# Altium footprint library module-footprint.PcbLib: 27 footprints (part 2 of 2)
Each footprint in its own frame and in the unit in brackets; x right, y up, seen from the top. Pads: shape width x height; smd on the part's side, far side on the other; paste and mask are expansions set on the pad; w line width, h text height; cw(c..) or ccw(c..) is an arc to the next point about the centre after c.
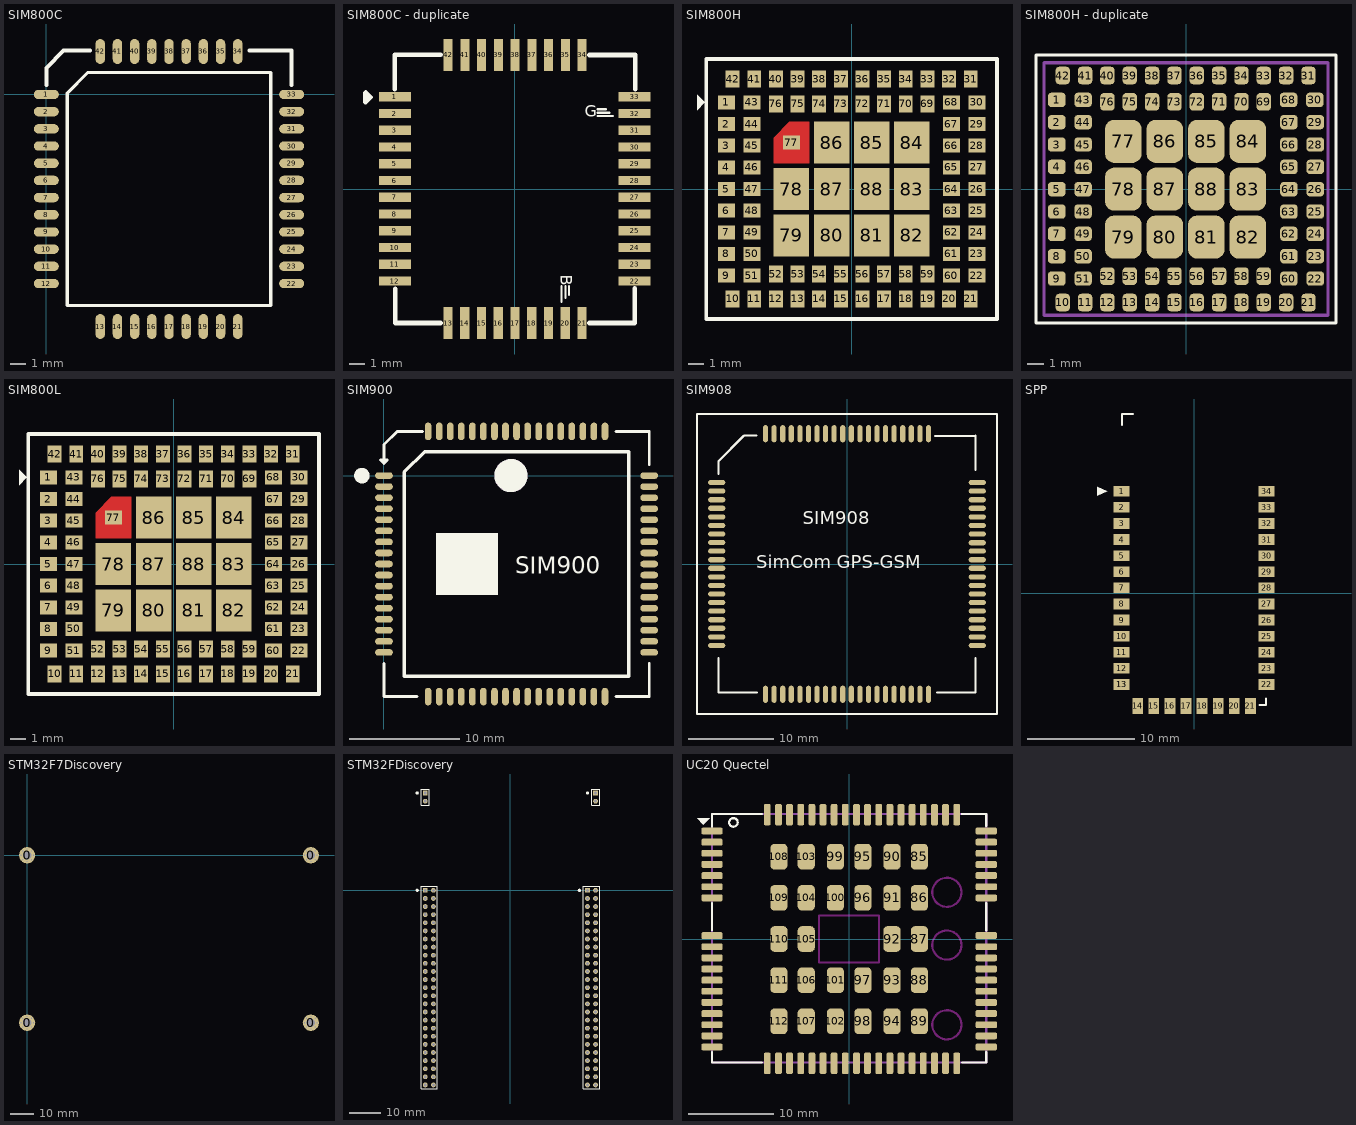
[diagram p1: the footprints below, top view; thin cyan lines are the x and y axes]

## SIM800C [mm]
pads (42):
  oval 1.6x0.6 smd: 1(0,0) 2(0,-1.1) 3(0,-2.2) 4(0,-3.3) 5(0,-4.4) 6(0,-5.5) 7(0,-6.6) 8(0,-7.7) 9(0,-8.8) 10(0,-9.9) 11(0,-11) 12(0,-12.1) 22(15.7,-12.1) 23(15.7,-11) 24(15.7,-9.9) 25(15.7,-8.8) 26(15.7,-7.7) 27(15.7,-6.6) 28(15.7,-5.5) 29(15.7,-4.4) 30(15.7,-3.3) 31(15.7,-2.2) 32(15.7,-1.1) 33(15.7,0)
  oval 0.6x1.6 smd: 13(3.45,-14.85) 14(4.55,-14.85) 15(5.65,-14.85) 16(6.75,-14.85) 17(7.85,-14.85) 18(8.95,-14.85) 19(10.05,-14.85) 20(11.15,-14.85) 21(12.25,-14.85) 34(12.25,2.75) 35(11.15,2.75) 36(10.05,2.75) 37(8.95,2.75) 38(7.85,2.75) 39(6.75,2.75) 40(5.65,2.75) 41(4.55,2.75) 42(3.45,2.75)
Top Overlay:
  lines w0.2: 1.335,-13.515 1.335,0.08 2.67,1.415 14.365,1.415 14.365,-13.515 1.335,-13.515
  lines w0.254: 0,0.6 0,1.7 1.1,2.8 2.8,2.8 ; 13,2.8 15.7,2.8 15.7,0.6
3D body "User Library-SIM800C-1.STEP": height 2.37, standoff 0.03, extent -0.01,-14.85 15.69,2.75

## SIM800C - duplicate [mm]
pads (42):
  rect 2.1x0.6 smd: 1(-7.87,6.058) 2(-7.87,4.958) 3(-7.87,3.858) 4(-7.87,2.758) 5(-7.87,1.658) 6(-7.87,0.558) 7(-7.87,-0.542) 8(-7.87,-1.642) 9(-7.87,-2.742) 10(-7.87,-3.842) 11(-7.87,-4.942) 12(-7.87,-6.042) 22(7.87,-6.042) 23(7.87,-4.942) 24(7.87,-3.842) 25(7.87,-2.742) 26(7.87,-1.642) 27(7.87,-0.542) 28(7.87,0.558) 29(7.87,1.658) 30(7.87,2.758) 31(7.87,3.858) 32(7.87,4.958) 33(7.87,6.058)
  rect 0.6x2.1 smd: 13(-4.378,-8.801) 14(-3.278,-8.801) 15(-2.178,-8.801) 16(-1.078,-8.801) 17(0.022,-8.801) 18(1.122,-8.801) 19(2.222,-8.801) 20(3.322,-8.801) 21(4.422,-8.801) 34(4.43,8.801) 35(3.33,8.801) 36(2.23,8.801) 37(1.13,8.801) 38(0.03,8.801) 39(-1.07,8.801) 40(-2.17,8.801) 41(-3.27,8.801) 42(-4.37,8.801)
Top Overlay:
  lines w0.15: 3.078,-7.404 3.078,-6.388 ; 3.332,-7.15 3.332,-6.388 ; 3.56,-6.947 3.56,-6.388 ; 5.44,4.788 6.456,4.788 ; 5.44,5.016 6.202,5.016 ; 5.44,5.245 5.999,5.245
  lines w0.3: -9.8,6.312 -9.8,5.702 -9.495,6.007 ; -9.775,6.337 -9.47,6.032 ; -7.87,6.54 -7.87,8.808 -5.22,8.808 -4.856,8.808 ; -7.858,-6.54 -7.858,-8.801 -4.853,-8.801 ; 4.904,-8.801 7.87,-8.801 7.87,-7.861 7.87,-6.515 ; 4.906,8.801 5.248,8.801 7.898,8.801 ; 7.915,6.54 7.915,8.808
  text "G" at 4.602,4.737 h0.76
  text "B" at 3.027,-5.626 h0.76
3D body "User Library-SIM800C-1.STEP": height 2.47, standoff 0.13, extent -7.8,-8.8 7.9,8.8

## SIM800H [mm]
pads (88):
  rect 1.1x0.9 smd: 1(-8.1,5.6) 2(-8.1,4.2) 3(-8.1,2.8) 4(-8.1,1.4) 5(-8.1,0) 6(-8.1,-1.4) 7(-8.1,-2.8) 8(-8.1,-4.2) 9(-8.1,-5.6) 22(8.1,-5.6) 23(8.1,-4.2) 24(8.1,-2.8) 25(8.1,-1.4) 26(8.1,0) 27(8.1,1.4) 28(8.1,2.8) 29(8.1,4.2) 30(8.1,5.6) 43(-6.45,5.6) 44(-6.45,4.2) 45(-6.45,2.8) 46(-6.45,1.4) 47(-6.45,0) 48(-6.45,-1.4) 49(-6.45,-2.8) 50(-6.45,-4.2) 51(-6.45,-5.6) 60(6.45,-5.6) 61(6.45,-4.2) 62(6.45,-2.8) 63(6.45,-1.4) 64(6.45,0) 65(6.45,1.4) 66(6.45,2.8) 67(6.45,4.2) 68(6.45,5.6) 77(-3.9,3)
  rect 0.9x1.1 smd: 10(-7.7,-7.1) 11(-6.3,-7.1) 12(-4.9,-7.1) 13(-3.5,-7.1) 14(-2.1,-7.1) 15(-0.7,-7.1) 16(0.7,-7.1) 17(2.1,-7.1) 18(3.5,-7.1) 19(4.9,-7.1) 20(6.3,-7.1) 21(7.7,-7.1) 31(7.7,7.1) 32(6.3,7.1) 33(4.9,7.1) 34(3.5,7.1) 35(2.1,7.1) 36(0.7,7.1) 37(-0.7,7.1) 38(-2.1,7.1) 39(-3.5,7.1) 40(-4.9,7.1) 41(-6.3,7.1) 42(-7.7,7.1) 52(-4.9,-5.5) 53(-3.5,-5.5) 54(-2.1,-5.5) 55(-0.7,-5.5) 56(0.7,-5.5) 57(2.1,-5.5) 58(3.5,-5.5) 59(4.9,-5.5) 69(4.9,5.5) 70(3.5,5.5) 71(2.1,5.5) 72(0.7,5.5) 73(-0.7,5.5) 74(-2.1,5.5) 75(-3.5,5.5) 76(-4.9,5.5)
  rect 2.3x2.7 smd: 78(-3.9,0) 79(-3.9,-3) 80(-1.3,-3) 81(1.3,-3) 82(3.9,-3) 83(3.9,0) 84(3.9,3) 85(1.3,3) 86(-1.3,3) 87(-1.3,0) 88(1.3,0)
Top Layer:
  region: -5.05,1.65 -2.75,1.65 -2.75,4.35 -4.02,4.35 -5.05,3.32
Top Overlay:
  region: -9.5,5.6 -10,6.1 -10,5.1
  lines w0.254: -9.4,-8.4 -9.4,8.4 9.4,8.4 9.4,-8.4 -9.4,-8.4
3D body "User Library-SIM800H.step": height 2.42, standoff 0, extent -8.9,-7.9 8.9,7.9

## SIM800H - duplicate [mm]
pads (88):
  rrect50% 1.1x0.9 smd: 1(-8.1,5.587) 2(-8.1,4.187) 3(-8.1,2.787) 4(-8.1,1.387) 5(-8.1,-0.013) 6(-8.1,-1.413) 7(-8.1,-2.813) 8(-8.1,-4.213) 9(-8.1,-5.613) 22(8.1,-5.613) 23(8.1,-4.212) 24(8.1,-2.812) 25(8.1,-1.412) 26(8.1,-0.012) 27(8.1,1.388) 28(8.1,2.788) 29(8.1,4.188) 30(8.075,5.587) 43(-6.45,5.587) 44(-6.45,4.187) 45(-6.45,2.787) 46(-6.45,1.387) 47(-6.45,-0.013) 48(-6.45,-1.413) 49(-6.45,-2.813) 50(-6.45,-4.213) 51(-6.45,-5.613) 60(6.45,-5.613) 61(6.45,-4.213) 62(6.45,-2.813) 63(6.45,-1.413) 64(6.45,-0.013) 65(6.45,1.387) 66(6.45,2.787) 67(6.45,4.187) 68(6.425,5.587)
  rrect50% 0.9x1.1 smd: 10(-7.725,-7.113) 11(-6.325,-7.113) 12(-4.925,-7.113) 13(-3.525,-7.113) 14(-2.125,-7.113) 15(-0.725,-7.113) 16(0.675,-7.113) 17(2.075,-7.113) 18(3.475,-7.113) 19(4.875,-7.113) 20(6.275,-7.113) 21(7.675,-7.113) 31(7.675,7.113) 32(6.275,7.113) 33(4.875,7.113) 34(3.475,7.113) 35(2.075,7.113) 36(0.675,7.113) 37(-0.725,7.113) 38(-2.125,7.113) 39(-3.525,7.113) 40(-4.925,7.113) 41(-6.325,7.113) 42(-7.725,7.113) 52(-4.925,-5.463) 53(-3.525,-5.463) 54(-2.125,-5.463) 55(-0.725,-5.463) 56(0.675,-5.463) 57(2.075,-5.463) 58(3.475,-5.463) 59(4.875,-5.463) 69(4.875,5.463) 70(3.475,5.463) 71(2.075,5.463) 72(0.675,5.463) 73(-0.725,5.463) 74(-2.125,5.463) 75(-3.525,5.463) 76(-4.925,5.463)
  rrect50% 2.3x2.7 smd: 77(-3.925,2.987) 78(-3.925,-0.013) 79(-3.925,-3.013) 80(-1.325,-3.013) 81(1.275,-3.013) 82(3.875,-3.013) 83(3.875,-0.013) 84(3.875,2.987) 85(1.275,2.987) 86(-1.325,2.987) 87(-1.325,-0.013) 88(1.275,-0.013)
Top Overlay:
  lines w0.2: -9.4,-8.4 -9.4,8.4 9.4,8.4 9.4,-8.4 -9.4,-8.4
Mechanical 1:
  lines w0.2: -8.9,-7.912 8.9,-7.912 8.9,7.913 -8.9,7.913 -8.9,-7.912
3D body "User Library-SIM800H.STEP": height 2.42, standoff 0, extent -8.9,-7.9 8.9,7.9

## SIM800L [mm]
pads (88):
  rect 1.1x0.9 smd: 1(-8.1,5.6) 2(-8.1,4.2) 3(-8.1,2.8) 4(-8.1,1.4) 5(-8.1,0) 6(-8.1,-1.4) 7(-8.1,-2.8) 8(-8.1,-4.2) 9(-8.1,-5.6) 22(8.1,-5.6) 23(8.1,-4.2) 24(8.1,-2.8) 25(8.1,-1.4) 26(8.1,0) 27(8.1,1.4) 28(8.1,2.8) 29(8.1,4.2) 30(8.1,5.6) 43(-6.45,5.6) 44(-6.45,4.2) 45(-6.45,2.8) 46(-6.45,1.4) 47(-6.45,0) 48(-6.45,-1.4) 49(-6.45,-2.8) 50(-6.45,-4.2) 51(-6.45,-5.6) 60(6.45,-5.6) 61(6.45,-4.2) 62(6.45,-2.8) 63(6.45,-1.4) 64(6.45,0) 65(6.45,1.4) 66(6.45,2.8) 67(6.45,4.2) 68(6.45,5.6) 77(-3.9,3)
  rect 0.9x1.1 smd: 10(-7.7,-7.1) 11(-6.3,-7.1) 12(-4.9,-7.1) 13(-3.5,-7.1) 14(-2.1,-7.1) 15(-0.7,-7.1) 16(0.7,-7.1) 17(2.1,-7.1) 18(3.5,-7.1) 19(4.9,-7.1) 20(6.3,-7.1) 21(7.7,-7.1) 31(7.7,7.1) 32(6.3,7.1) 33(4.9,7.1) 34(3.5,7.1) 35(2.1,7.1) 36(0.7,7.1) 37(-0.7,7.1) 38(-2.1,7.1) 39(-3.5,7.1) 40(-4.9,7.1) 41(-6.3,7.1) 42(-7.7,7.1) 52(-4.9,-5.5) 53(-3.5,-5.5) 54(-2.1,-5.5) 55(-0.7,-5.5) 56(0.7,-5.5) 57(2.1,-5.5) 58(3.5,-5.5) 59(4.9,-5.5) 69(4.9,5.5) 70(3.5,5.5) 71(2.1,5.5) 72(0.7,5.5) 73(-0.7,5.5) 74(-2.1,5.5) 75(-3.5,5.5) 76(-4.9,5.5)
  rect 2.3x2.7 smd: 78(-3.9,0) 79(-3.9,-3) 80(-1.3,-3) 81(1.3,-3) 82(3.9,-3) 83(3.9,0) 84(3.9,3) 85(1.3,3) 86(-1.3,3) 87(-1.3,0) 88(1.3,0)
Top Layer:
  region: -5.05,1.65 -2.75,1.65 -2.75,4.35 -4.02,4.35 -5.05,3.32
Top Overlay:
  region: -9.5,5.6 -10,6.1 -10,5.1
  lines w0.254: -9.4,-8.4 -9.4,8.4 9.4,8.4 9.4,-8.4 -9.4,-8.4
3D body "User Library-SIM800L-1.step": height 2.5, standoff 0, extent -8.925,-7.9 8.925,7.9

## SIM900 [mm]
pads (68):
  oval 1.6x0.6 smd: 1(0,0) 2(0,-1) 3(0,-2) 4(0,-3) 5(0,-4) 6(0,-5) 7(0,-6) 8(0,-7) 9(0,-8) 10(0,-9) 11(0,-10) 12(0,-11) 13(0,-12) 14(0,-13) 15(0,-14) 16(0,-15) 17(0,-16) 35(24,-16) 36(24,-15) 37(24,-14) 38(24,-13) 39(24,-12) 40(24,-11) 41(24,-10) 42(24,-9) 43(24,-8) 44(24,-7) 45(24,-6) 46(24,-5) 47(24,-4) 48(24,-3) 49(24,-2) 50(24,-1) 51(24,0)
  oval 0.6x1.6 smd: 18(4,-20) 19(5,-20) 20(6,-20) 21(7,-20) 22(8,-20) 23(9,-20) 24(10,-20) 25(11,-20) 26(12,-20) 27(13,-20) 28(14,-20) 29(15,-20) 30(16,-20) 31(17,-20) 32(18,-20) 33(19,-20) 34(20,-20) 52(20,4) 53(19,4) 54(18,4) 55(17,4) 56(16,4) 57(15,4) 58(14,4) 59(13,4) 60(12,4) 61(11,4) 62(10,4) 63(9,4) 64(8,4) 65(7,4) 66(6,4) 67(5,4) 68(4,4)
Top Overlay:
  circle w1.5: c11.5,0 r0.75
  circle w0.7: c-2,0 r0.35
  rectangle: 4.7,-10.8 10.3,-5.2
  lines w0.254: 0,-17 0,-20 3,-20 ; 0,1.4 0,2.8 1.2,4 3.5,4 ; 21,-20 24,-20 24,-17 ; 21,4 24,4 24,1 ; 0,1.1 0,1.1 ; 0,1.1 -0.3,1.4 0.3,1.4 0,1.1
  lines w0.3: 1.835,-18.165 22.165,-18.165 22.165,2.165 3.67,2.165 1.835,0.33 1.835,-18.165
  text "SIM900" at 11.9,-8.9 h1.52
Keep-Out Layer:
  circle w1.5: c11.5,0 r0.75
  rectangle: 4.7,-10.8 10.3,-5.2
3D body "User Library-SIM900.step": height 3.12, standoff 0.1, extent 0,-20 24,4

## SIM908 [mm]
pads (80):
  oval 2x0.6 smd: 1(-15.2,9.5) 2(-15.2,8.5) 3(-15.2,7.5) 4(-15.2,6.5) 5(-15.2,5.5) 6(-15.2,4.5) 7(-15.2,3.5) 8(-15.2,2.5) 9(-15.2,1.5) 10(-15.2,0.5) 11(-15.2,-0.5) 12(-15.2,-1.5) 13(-15.2,-2.5) 14(-15.2,-3.5) 15(-15.2,-4.5) 16(-15.2,-5.5) 17(-15.2,-6.5) 18(-15.2,-7.5) 19(-15.2,-8.5) 20(-15.2,-9.5) 41(15.2,-9.5) 42(15.2,-8.5) 43(15.2,-7.5) 44(15.2,-6.5) 45(15.2,-5.5) 46(15.2,-4.5) 47(15.2,-3.5) 48(15.2,-2.5) 49(15.2,-1.5) 50(15.2,-0.5) 51(15.2,0.5) 52(15.2,1.5) 53(15.2,2.475) 54(15.2,3.5) 55(15.2,4.5) 56(15.2,5.5) 57(15.2,6.5) 58(15.2,7.5) 59(15.2,8.5) 60(15.2,9.5)
  oval 0.6x2 smd: 21(-9.5,-15.2) 22(-8.5,-15.2) 23(-7.5,-15.2) 24(-6.5,-15.2) 25(-5.5,-15.2) 26(-4.5,-15.2) 27(-3.5,-15.2) 28(-2.5,-15.2) 29(-1.5,-15.2) 30(-0.5,-15.2) 31(0.5,-15.2) 32(1.5,-15.2) 33(2.5,-15.2) 34(3.5,-15.2) 35(4.5,-15.2) 36(5.5,-15.2) 37(6.5,-15.2) 38(7.5,-15.2) 39(8.5,-15.2) 40(9.5,-15.2) 61(9.5,15.2) 62(8.5,15.2) 63(7.5,15.2) 64(6.5,15.2) 65(5.5,15.2) 66(4.5,15.2) 67(3.5,15.2) 68(2.5,15.2) 69(1.5,15.2) 70(0.5,15.2) 71(-0.5,15.2) 72(-1.5,15.2) 73(-2.5,15.2) 74(-3.5,15.2) 75(-4.5,15.2) 76(-5.5,15.2) 77(-6.5,15.2) 78(-7.5,15.2) 79(-8.5,15.2) 80(-9.5,15.2)
Top Overlay:
  lines w0.254: -15,-11 -15,-15 -10.5,-15 ; -15,10.5 -15,12 -12.076,14.924 -12,14.924 -12,15 -10.576,15 ; 10.298,14.924 14.924,14.924 ; 10.5,-15 15,-15 15,-11 ; 14.924,17.5 17.5,17.5 17.5,-17.5 -17.5,-17.5 -17.5,17.5 15,17.5 ; 15,11 15,15
  text "SIM908" at -5.176,4.66 h1.52
  text "SimCom GPS-GSM" at -10.576,-0.5 h1.52
3D body: height 3.09, standoff -0.11, extent -14.991,-15.002 15.009,14.998

## SPP [mm]
height 1.5
pads (35):
  rect 1.5x1 smd: 1(-6.75,9.5) 2(-6.75,8) 3(-6.75,6.5) 4(-6.75,5) 5(-6.75,3.5) 6(-6.75,2) 7(-6.75,0.5) 8(-6.75,-1) 9(-6.75,-2.5) 10(-6.75,-4) 11(-6.75,-5.5) 12(-6.75,-7) 13(-6.75,-8.5) 13(-6.75,-8.5) 22(6.75,-8.5) 23(6.75,-7) 24(6.75,-5.5) 25(6.75,-4) 26(6.75,-2.5) 27(6.75,-1) 28(6.75,0.5) 29(6.75,2) 30(6.75,3.5) 31(6.75,5) 32(6.75,6.5) 33(6.75,8) 34(6.75,9.5)
  rect 1x1.5 smd: 14(-5.25,-10.5) 15(-3.75,-10.5) 16(-2.25,-10.5) 17(-0.75,-10.5) 18(0.75,-10.5) 19(2.25,-10.5) 20(3.75,-10.5) 21(5.25,-10.5)
Top Overlay:
  region: -8.1,9.5 -9,9.9 -9,9.1
  lines w0.2: -6.7,15.7 -6.7,16.7 -5.7,16.7 ; 6.1,-10.4 6.7,-10.4 6.7,-9.8
3D body "SPP.STEP": height 1.6, standoff 0, extent -6.5,-10.25 6.5,16.45

## STM32F7Discovery [mm]
pads (4):
  round 7 hole 3.7: 0(0,-72) 0(0,0) 0(122,-72) 0(122,0)
via 123.9,-70.1 diameter 1 hole 0.5
via 120.1,-70.1 diameter 1 hole 0.5
via 120.1,-73.9 diameter 1 hole 0.5
via 123.9,-73.9 diameter 1 hole 0.5
via 119.3,-72 diameter 1 hole 0.5
via 122,-74.7 diameter 1 hole 0.5
via 124.7,-72 diameter 1 hole 0.5
via 122,-69.3 diameter 1 hole 0.5
via 123.9,1.9 diameter 1 hole 0.5
via 120.1,1.9 diameter 1 hole 0.5
via 120.1,-1.9 diameter 1 hole 0.5
via 123.9,-1.9 diameter 1 hole 0.5
via 119.3,0 diameter 1 hole 0.5
via 122,-2.7 diameter 1 hole 0.5
via 124.7,0 diameter 1 hole 0.5
via 122,2.7 diameter 1 hole 0.5
via 1.9,-70.1 diameter 1 hole 0.5
via -1.9,-70.1 diameter 1 hole 0.5
via -1.9,-73.9 diameter 1 hole 0.5
via 1.9,-73.9 diameter 1 hole 0.5
via -2.7,-72 diameter 1 hole 0.5
via 0,-74.7 diameter 1 hole 0.5
via 2.7,-72 diameter 1 hole 0.5
via 0,-69.3 diameter 1 hole 0.5
via 1.9,1.9 diameter 1 hole 0.5
via -1.9,1.9 diameter 1 hole 0.5
via -1.9,-1.9 diameter 1 hole 0.5
via 1.9,-1.9 diameter 1 hole 0.5
via -2.7,0 diameter 1 hole 0.5
via 0,-2.7 diameter 1 hole 0.5
via 2.7,0 diameter 1 hole 0.5
via 0,2.7 diameter 1 hole 0.5

## STM32FDiscovery [mm]
pads (104):
  round 1.5 hole 0.9: 3V(24.13,-5.08) 3V(26.67,-5.08) 5V(24.13,-2.54) 5V(26.67,-2.54) 6(-24.13,-5.08) 7(-26.67,-7.62) 8(-24.13,-7.62) 9(-26.67,-10.16) 10(-24.13,-10.16) 11(-26.67,-12.7) 12(-24.13,-12.7) 13(-26.67,-15.24) 14(-24.13,-15.24) 15(-26.67,-17.78) 16(-24.13,-17.78) 17(-26.67,-20.32) 18(-24.13,-20.32) 19(-26.67,-22.86) 20(-24.13,-22.86) 21(-26.67,-25.4) 22(-24.13,-25.4) 24(-24.13,-27.94) 25(-26.67,-30.48) 26(-24.13,-30.48) 27(-26.67,-33.02) 28(-24.13,-33.02) 29(-26.67,-35.56) 30(-24.13,-35.56) 31(-26.67,-38.1) 32(-24.13,-38.1) 33(-26.67,-40.64) 34(-24.13,-40.64) 35(-26.67,-43.18) 36(-24.13,-43.18) 37(-26.67,-45.72) 38(-24.13,-45.72) 39(-26.67,-48.26) 40(-24.13,-48.26) 41(-26.67,-50.8) 42(-24.13,-50.8) 43(-26.67,-53.34) 44(-24.13,-53.34) 45(-26.67,-55.88) 46(-24.13,-55.88) 47(-26.67,-58.42) 48(-24.13,-58.42) 57(24.13,-7.62) 58(26.67,-7.62) 59(24.13,-10.16) 60(26.67,-10.16) 61(24.13,-12.7) 62(26.67,-12.7) 63(24.13,-15.24) 64(26.67,-15.24) 65(24.13,-17.78) 66(26.67,-17.78) 67(24.13,-20.32) 68(26.67,-20.32) 69(24.13,-22.86) 70(26.67,-22.86) 71(24.13,-25.4) 72(26.67,-25.4) 73(24.13,-27.94) 74(26.67,-27.94) 75(24.13,-30.48) 76(26.67,-30.48) 77(24.13,-33.02) 78(26.67,-33.02) 79(24.13,-35.56) 80(26.67,-35.56) 81(24.13,-38.1) 82(26.67,-38.1) 83(24.13,-40.64) 84(26.67,-40.64) 85(24.13,-43.18) 86(26.67,-43.18) 87(24.13,-45.72) 88(26.67,-45.72) 89(24.13,-48.26) 90(26.67,-48.26) 91(24.13,-50.8) 92(26.67,-50.8) 93(24.13,-53.34) 94(26.67,-53.34) 95(24.13,-55.88) 96(26.67,-55.88) 97(24.13,-58.42) 98(26.67,-58.42) GND(-26.67,-60.96) GND(-26.67,-27.94) GND(-26.67,-5.08) GND(-26.67,27.94) GND(-24.13,-60.96) GND(-24.13,0) GND(24.13,-60.96) GND(26.67,-60.96) GND(26.67,0) GND(26.67,27.94) VDD(-26.67,-2.54) VDD(-24.13,-2.54)
  rect 1.5x1.5 hole 0.9: GND(-26.67,0) GND(-26.67,30.48) GND(24.13,0) GND(26.67,30.48)
Top Overlay:
  circle w0.508: c24.13,30.48 r0.254
  circle w0.508: c-29.21,30.48 r0.254
  circle w0.508: c21.59,0 r0.254
  circle w0.508: c-29.21,0 r0.254
  lines w0.254: -27.94,-62.23 -22.86,-62.23 -22.86,1.27 -27.94,1.27 -27.94,-62.23 ; -27.94,26.67 -25.4,26.67 -25.4,31.75 -27.94,31.75 -27.94,26.67 ; 22.86,-62.23 22.86,1.27 27.94,1.27 27.94,-62.23 22.86,-62.23 ; 25.4,26.67 27.94,26.67 27.94,31.75 25.4,31.75 25.4,26.67
3D body "stm30f4.STEP": height 24.5, standoff 1.5, extent -32.767,-67.468 32.733,35.098
3D body "female_header_a-bl254-eg-g02d.stp": height 8.55, standoff -3.15, extent 25.44,26.545 27.94,31.875
3D body "female_header_a-bl254-eg-g02d.stp": height 8.55, standoff -3.15, extent -27.9,26.545 -25.4,31.875
3D body "female_header_a-bl254-dg-g50d.stp": height 8.5, standoff -3.2, extent 22.9,-62.48 27.9,1.27
3D body "female_header_a-bl254-dg-g50d.stp": height 8.5, standoff -3.2, extent -27.9,-62.48 -22.9,1.27

## UC20 Quectel [mm]
pads (100):
  rrect50% 2.5x0.8 smd: 1(-16,12.6) 2(-16,11.3) 3(-16,10) 4(-16,8.7) 5(-16,7.4) 6(-16,6.1) 7(-16,4.8) 8(-16,0.4) 9(-16,-0.9) 10(-16,-2.2) 11(-16,-3.5) 12(-16,-4.8) 13(-16,-6.1) 14(-16,-7.4) 15(-16,-8.7) 16(-16,-10) 17(-16,-11.3) 18(-16,-12.6) 37(16,-12.6) 38(16,-11.3) 39(16,-10) 40(16,-8.7) 41(16,-7.4) 42(16,-6.1) 43(16,-4.8) 44(16,-3.5) 45(16,-2.2) 46(16,-0.9) 47(16,0.4) 48(16,4.8) 49(16,6.1) 50(16,7.4) 51(16,8.7) 52(16,10) 53(16,11.3) 54(16,12.6)
  rrect50% 0.8x2.5 smd: 19(-9.55,-14.5) 20(-8.25,-14.5) 21(-6.95,-14.5) 22(-5.65,-14.5) 23(-4.35,-14.5) 24(-3.05,-14.5) 25(-1.75,-14.5) 26(-0.45,-14.5) 27(0.85,-14.5) 28(2.15,-14.5) 29(3.45,-14.5) 30(4.75,-14.5) 31(6.05,-14.5) 32(7.35,-14.5) 33(8.65,-14.5) 34(9.95,-14.5) 35(11.25,-14.5) 36(12.55,-14.5) 55(12.55,14.5) 56(11.25,14.5) 57(9.95,14.5) 58(8.65,14.5) 59(7.35,14.5) 60(6.05,14.5) 61(4.75,14.5) 62(3.45,14.5) 63(2.15,14.5) 64(0.85,14.5) 65(-0.45,14.5) 66(-1.75,14.5) 67(-3.05,14.5) 68(-4.35,14.5) 69(-5.65,14.5) 70(-6.95,14.5) 71(-8.25,14.5) 72(-9.55,14.5)
  rrect50% 2x3 smd: 85(8.2,9.6) 86(8.2,4.8) 87(8.2,0) 88(8.2,-4.8) 89(8.2,-9.6) 90(5,9.6) 91(5,4.8) 92(5,0) 93(5,-4.8) 94(5,-9.6) 95(1.6,9.6) 96(1.6,4.8) 97(1.6,-4.8) 98(1.6,-9.6) 99(-1.6,9.6) 100(-1.6,4.8) 101(-1.6,-4.8) 102(-1.6,-9.6) 103(-5,9.6) 104(-5,4.8) 105(-5,0) 106(-5,-4.8) 107(-5,-9.6) 108(-8.2,9.6) 109(-8.2,4.8) 110(-8.2,0) 111(-8.2,-4.8) 112(-8.2,-9.6)
Top Overlay:
  circle w0.254: c-13.5,13.6 r0.5
  region: -17,13.35 -17.75,14.1 -16.25,14.1
  lines w0.25: -16,-13.2 -16,-14.4 -10.2,-14.4 ; -16,1 -16,4.2 ; -16,13.1 -16,14.6 -10.175,14.6 ; 13.1,14.6 16,14.6 16,13.2 ; 13.2,-14.4 16,-14.4 16,-13.2 ; 16,1 16,4.2
Keep-Out Layer:
  circle w0.254: c11.4,-10.01 r1.7
  circle w0.254: c11.4,-0.71 r1.7
  circle w0.254: c11.4,5.45 r1.7
  lines w0.25: -3.5,-2.75 3.5,-2.75 3.5,2.75 -3.5,2.75 -3.5,-2.75
Mechanical 1:
  lines w0.25: -16,-14.4 -16,14.6 16,14.6 16,-14.4 -16,-14.4
3D body: height 2.5, standoff 0.1, extent -16,-14.4 16,14.6